# Altium footprint library RNG_Footprints.PcbLib: 134 footprints (part 7 of 9)
Each footprint in its own frame and in the unit in brackets; x right, y up, seen from the top. Pads: shape width x height; smd on the part's side, far side on the other; paste and mask are expansions set on the pad; w line width, h text height; cw(c..) or ccw(c..) is an arc to the next point about the centre after c.
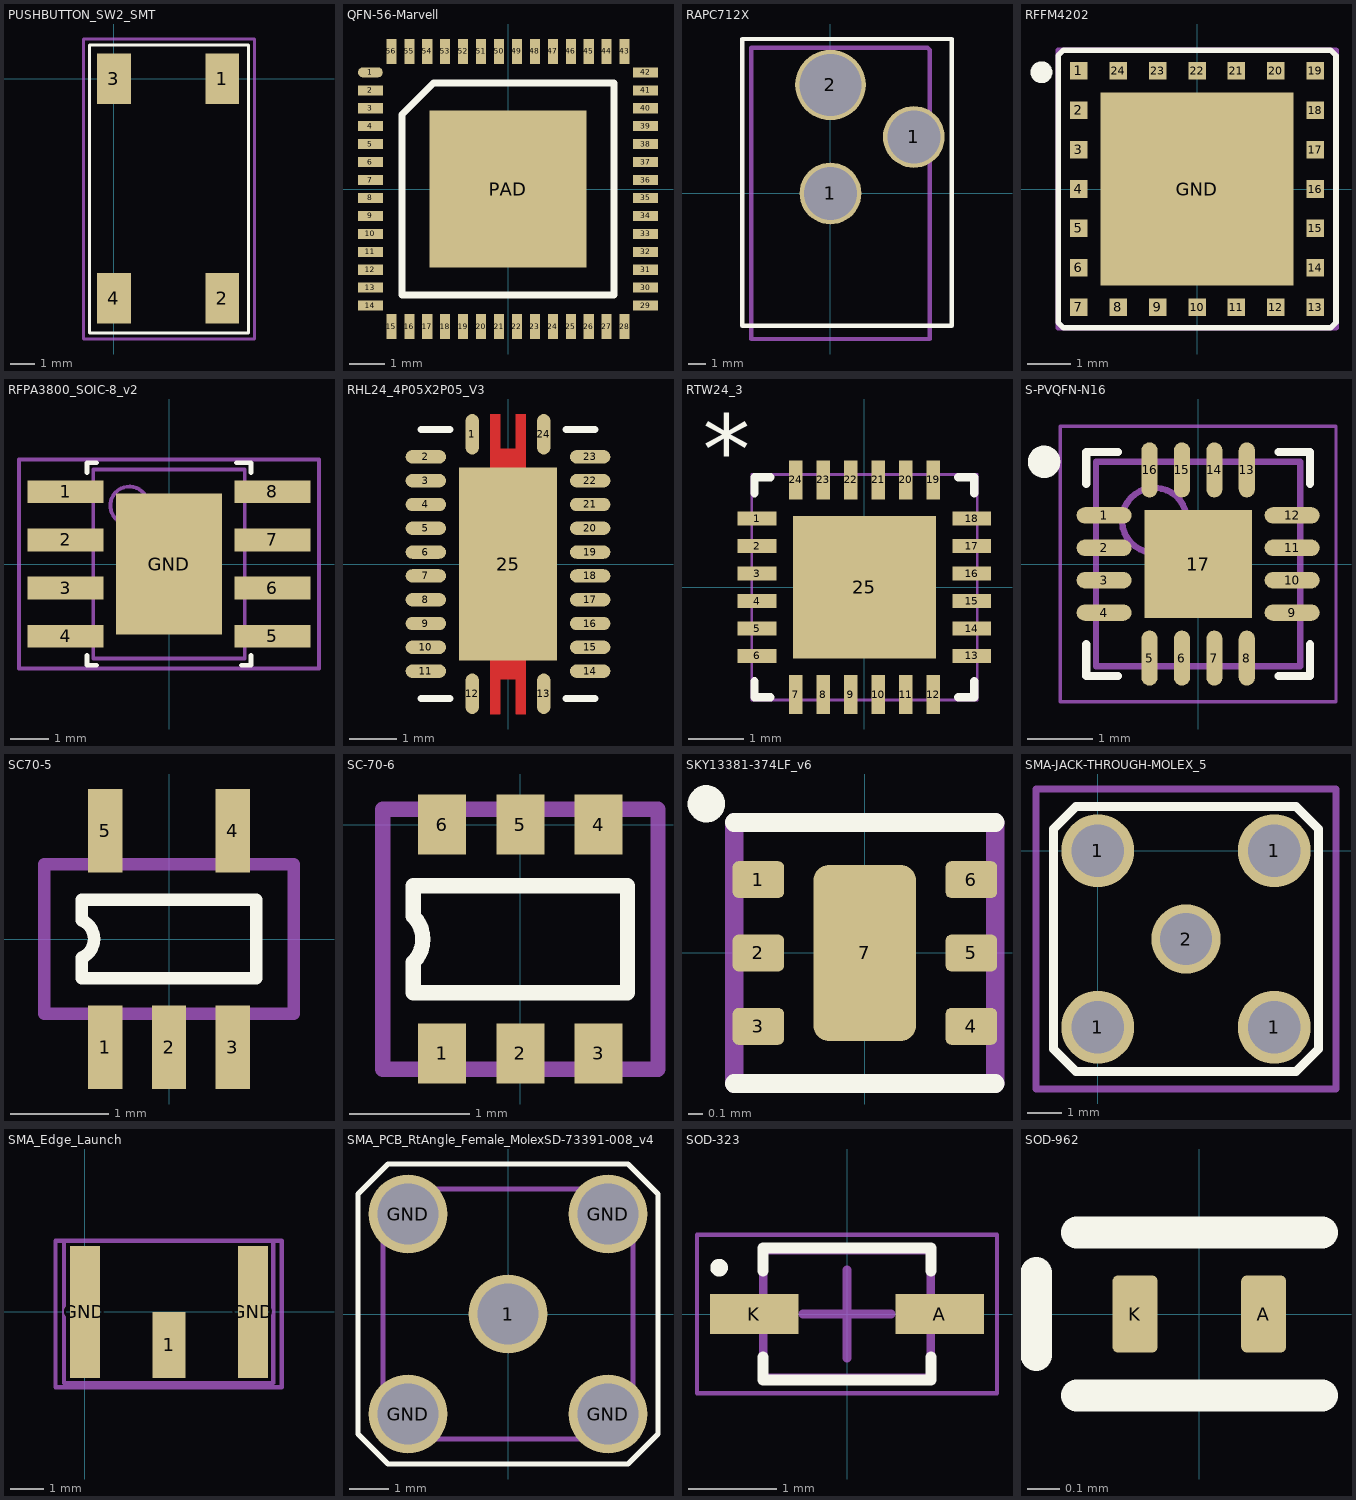
[diagram p6: the footprints below, top view; thin cyan lines are the x and y axes]

## PUSHBUTTON_SW2_SMT [mm] "SMT Pushbutton Switch, Mouser 506-1571563-9"
height 7.01
pads (4):
  rect 1.4x2.1 smd: 1(4.5,0) 2(4.5,-9.1) 3(0,0) 4(0,-9.1)
Top Overlay:
  lines w0.127: -1.016,-10.541 5.588,-10.541 5.588,1.397 -1.016,1.397 -1.016,-10.541
Mechanical 15:
  lines w0.127: -1.27,-10.795 5.842,-10.795 5.842,1.651 -1.27,1.651 -1.27,-10.795

## QFN-56-Marvell [mm]
pads (57):
  oval 0.69x0.28 smd: 1(-3.835,3.25)
  rect 0.69x0.28 smd: 2(-3.835,2.75) 3(-3.835,2.25) 4(-3.835,1.75) 5(-3.835,1.25) 6(-3.835,0.75) 7(-3.835,0.25) 8(-3.835,-0.25) 9(-3.835,-0.75) 10(-3.835,-1.25) 11(-3.835,-1.75) 12(-3.835,-2.25) 13(-3.835,-2.75) 14(-3.835,-3.25) 29(3.835,-3.25) 30(3.835,-2.75) 31(3.835,-2.25) 32(3.835,-1.75) 33(3.835,-1.25) 34(3.835,-0.75) 35(3.835,-0.25) 36(3.835,0.25) 37(3.835,0.75) 38(3.835,1.25) 39(3.835,1.75) 40(3.835,2.25) 41(3.835,2.75) 42(3.835,3.25)
  rect 0.28x0.69 smd: 15(-3.25,-3.835) 16(-2.75,-3.835) 17(-2.25,-3.835) 18(-1.75,-3.835) 19(-1.25,-3.835) 20(-0.75,-3.835) 21(-0.25,-3.835) 22(0.25,-3.835) 23(0.75,-3.835) 24(1.25,-3.835) 25(1.75,-3.835) 26(2.25,-3.835) 27(2.75,-3.835) 28(3.25,-3.835) 43(3.25,3.835) 44(2.75,3.835) 45(2.25,3.835) 46(1.75,3.835) 47(1.25,3.835) 48(0.75,3.835) 49(0.25,3.835) 50(-0.25,3.835) 51(-0.75,3.835) 52(-1.25,3.835) 53(-1.75,3.835) 54(-2.25,3.835) 55(-2.75,3.835) 56(-3.25,3.835)
  rect 4.37x4.37 smd: PAD(0,0)
Top Overlay:
  lines w0.2: -2.955,-2.955 -2.955,2.075 -2.075,2.955 2.955,2.955 2.955,-2.955 -2.955,-2.955
3D body "User Library-QFN56 (8x8).STEP": height 0.96, standoff 0.01, extent -4.015,-4.015 4.015,4.015

## RAPC712X [mil] "Rt Angle 2.5mm PCB Thru DC Power Jack RAPC712X"
height 1692.91
pads (3):
  round 140 hole 120: 1(0,0) 1(189,128)
  round 160 hole 140: 2(0,246)
Top Overlay:
  lines w10: -200,-300 -200,350 275,350 275,-300 -200,-300
Mechanical 15:
  lines w10: -180,-330 -180,330 220,330 225,325 225,-330 -180,-330
3D body: height 430, standoff 0, extent -175,-324 175,324

## RFFM4202 [mm] "RFFM4202_2.4GHZ_FEM_LAMINATE"
height 0.975
pads (25):
  rect 0.4x0.4 smd paste-0.02 mask+0.065: 1(-2.7,2.7) 2(-2.7,1.8) 3(-2.7,0.9) 4(-2.7,0) 5(-2.7,-0.9) 6(-2.7,-1.8) 7(-2.7,-2.7) 8(-1.8,-2.7) 9(-0.9,-2.7) 10(0,-2.7) 11(0.9,-2.7) 12(1.8,-2.7) 13(2.7,-2.7) 14(2.7,-1.8) 15(2.7,-0.9) 16(2.7,0) 17(2.7,0.9) 18(2.7,1.8) 19(2.7,2.7) 20(1.8,2.7) 21(0.9,2.7) 22(0,2.7) 23(-0.9,2.7) 24(-1.8,2.7)
  rect 4.4x4.4 smd paste-2.2 mask+0.065: GND(0,0)
Top Overlay:
  circle w0.25: c-3.554,2.667 r0.125
  lines w0.127: -3.175,-3.048 -3.048,-3.175 3.048,-3.175 3.175,-3.048 3.175,3.048 3.048,3.175 -3.048,3.175 -3.175,3.048 -3.175,-3.048
Top Paste:
  rectangle: -2.095,0.205 -0.205,2.095
  rectangle: 0.205,0.205 2.095,2.095
  rectangle: -2.095,-2.095 -0.205,-0.205
  rectangle: 0.205,-2.095 2.095,-0.205
Mechanical 15:
  lines w0.127: -3.175,-3.175 3.175,-3.175 3.175,3.175 -3.175,3.175 -3.175,-3.175
3D body: height 0.97, standoff 0, extent -3,-3 3,3

## RFPA3800_SOIC-8_v2 [mm] "SOIC, 8-Leads, Body 5.0x4.0mm (max), Pitch 1.27mm, IPC Medium Density"
height 1.727
pads (9):
  rect 2x0.6 smd: 1(-2.725,1.905) 2(-2.725,0.635) 3(-2.725,-0.635) 4(-2.725,-1.905) 5(2.725,-1.905) 6(2.725,-0.635) 7(2.725,0.635) 8(2.725,1.905)
  rect 2.8x3.7 smd: GND(0,0)
Top Overlay:
  lines w0.127: -2.159,-2.413 -2.159,-2.667 -1.905,-2.667 ; -2.159,2.413 -2.159,2.667 -1.905,2.667 ; 1.778,2.667 2.159,2.667 2.159,2.413 ; 1.905,-2.667 2.159,-2.667 2.159,-2.413
  text "." at -1.397,2.032 h0.76
Mechanical 13:
  circle w0.1: c-1.045,1.54 r0.5
  lines w0.1: -1.995,-2.49 1.995,-2.49 1.995,2.49 -1.995,2.49 -1.995,-2.49
Mechanical 15:
  lines w0.1: -0.5,0 0.5,0 ; 0,-0.5 0,0.5 ; -3.95,-2.75 3.95,-2.75 3.95,2.75 -3.95,2.75 -3.95,-2.75
3D body: height 1.73, standoff 0.19, extent -1.995,-2.49 1.995,2.49

## RHL24_4P05X2P05_V3 [mm] "TI Bus Translator RVQFN Package"
height 1
pads (25):
  oval 0.28x0.85 smd mask+0.064: 1(-0.75,2.725) 12(-0.75,-2.725) 13(0.75,-2.725) 24(0.75,2.725)
  oval 0.85x0.28 smd mask+0.064: 2(-1.725,2.25) 3(-1.725,1.75) 4(-1.725,1.25) 5(-1.725,0.75) 6(-1.725,0.25) 7(-1.725,-0.25) 8(-1.725,-0.75) 9(-1.725,-1.25) 10(-1.725,-1.75) 11(-1.725,-2.25) 14(1.725,-2.25) 15(1.725,-1.75) 16(1.725,-1.25) 17(1.725,-0.75) 18(1.725,-0.25) 19(1.725,0.25) 20(1.725,0.75) 21(1.725,1.25) 22(1.725,1.75) 23(1.725,2.25)
  rect 2.05x4.05 smd paste-3.175: 25(0,0)
Top Layer:
  region: -0.375,2.025 0.375,2.025 0.375,3.15 0.16,3.15 0.16,2.425 -0.16,2.425 -0.16,3.15 -0.375,3.15
  region: -0.375,-2.025 0.375,-2.025 0.375,-3.15 0.16,-3.15 0.16,-2.425 -0.16,-2.425 -0.16,-3.15 -0.375,-3.15
Top Overlay:
  lines w0.152: -1.825,-2.825 -1.223,-2.825 ; -1.825,2.825 -1.223,2.825 ; 1.223,-2.825 1.825,-2.825 ; 1.223,2.825 1.825,2.825
  text "." at -1.524,3.429 h1.27
Top Paste:
  rectangle: 0.03,-0.55 0.97,0.55
  rectangle: -0.97,-0.55 -0.03,0.55
  rectangle: -0.97,0.847 -0.03,1.947
  rectangle: 0.046,0.847 0.986,1.947
  rectangle: -0.97,-1.947 -0.03,-0.847
  rectangle: 0.046,-1.947 0.986,-0.847
  rectangle: -0.33,-3.048 -0.203,-2.032
  rectangle: 0.203,-3.048 0.33,-2.032
  rectangle: 0.203,2.032 0.33,3.048
  rectangle: -0.33,2.032 -0.203,3.048
3D body: height 1, standoff 0.08, extent -1.825,-2.825 1.825,2.825

## RTW24_3 [mm] "WQFN-24_TI"
height 0.8
pads (25):
  rect 0.705x0.25 smd mask+0.076: 1(-1.952,1.25) 2(-1.952,0.75) 3(-1.952,0.25) 4(-1.952,-0.25) 5(-1.952,-0.75) 6(-1.952,-1.25) 13(1.952,-1.25) 14(1.952,-0.75) 15(1.952,-0.25) 16(1.952,0.25) 17(1.952,0.75) 18(1.952,1.25)
  rect 0.25x0.705 smd mask+0.076: 7(-1.25,-1.952) 8(-0.75,-1.952) 9(-0.25,-1.952) 10(0.25,-1.952) 11(0.75,-1.952) 12(1.25,-1.952) 19(1.25,1.952) 20(0.75,1.952) 21(0.25,1.952) 22(-0.25,1.952) 23(-0.75,1.952) 24(-1.25,1.952)
  rect 2.6x2.6 smd paste-1.287: 25(0,0)
Top Overlay:
  lines w0.152: -2,-1.708 -2,-2 -1.708,-2 ; -2,1.708 -2,2 -1.708,2 ; 1.708,-2 2,-2 2,-1.708 ; 1.708,2 2,2 2,1.708
  text "*" at -2.94,1.881 h1.27
Top Paste:
  region: 1.2,-0.1 0.1,-0.1 0.1,-1.2 1.2,-1.2
  region: 1.2,1.2 0.1,1.2 0.1,0.1 1.2,0.1
  region: -0.1,-0.1 -1.2,-0.1 -1.2,-1.2 -0.1,-1.2
  region: -0.1,1.2 -1.2,1.2 -1.2,0.1 -0.1,0.1
Mechanical 13:
  lines w0.05: -2.05,-2.05 -2.05,2.05 2.05,2.05 2.05,-2.05 -2.05,-2.05
3D body "User Library-QFN 24 4x4.STEP": height 0.91, standoff 0.01, extent -2.002,-2.002 2.002,2.002

## S-PVQFN-N16 [mm] "QFN, 16-Leads, Body 3.00x3.00mm, Pitch 0.50mm, Thermal Pad 1.66x1.66mm, IPC Medium Density"
height 1
pads (17):
  oval 0.85x0.25 smd: 1(-1.45,0.75) 2(-1.45,0.25) 3(-1.45,-0.25) 4(-1.45,-0.75) 9(1.45,-0.75) 10(1.45,-0.25) 11(1.45,0.25) 12(1.45,0.75)
  oval 0.25x0.85 smd: 5(-0.75,-1.45) 6(-0.25,-1.45) 7(0.25,-1.45) 8(0.75,-1.45) 13(0.75,1.45) 14(0.25,1.45) 15(-0.25,1.45) 16(-0.75,1.45)
  rect 1.66x1.66 smd: 17(0,0)
Top Overlay:
  circle w0.25: c-2.375,1.575 r0.125
  lines w0.125: -1.725,-1.238 -1.725,-1.725 -1.238,-1.725 ; -1.725,1.238 -1.725,1.725 -1.238,1.725 ; 1.238,-1.725 1.725,-1.725 1.725,-1.238 ; 1.238,1.725 1.725,1.725 1.725,1.238
Mechanical 13:
  circle w0.1: c-0.675,0.675 r0.5
  lines w0.1: -1.575,-1.575 -1.575,1.575 1.575,1.575 1.575,-1.575 -1.575,-1.575
Mechanical 15:
  lines w0.05: -2.125,-2.125 -2.125,2.125 2.125,2.125 2.125,-2.125 -2.125,-2.125
  lines w0.1: -0.5,0 0.5,0 ; 0,-0.5 0,0.5
3D body: height 1, standoff 0.08, extent -1.575,-1.575 1.575,1.575

## SC70-5 [mm] "TI SC70 5-pin package"
height 1.1
pads (5):
  rect 0.35x0.85 smd mask+0.05: 1(-0.65,-1.1) 2(0,-1.1) 3(0.65,-1.1) 4(0.65,1.1) 5(-0.65,1.1)
Top Overlay:
  lines w0.127: -0.889,-0.4 0.889,-0.4 0.889,0.4 -0.889,0.4 -0.889,0.191 cw(c-0.968,0) -0.889,-0.191 -0.889,-0.4
  text "." at -1.143,-0.762 h0.5
Mechanical 15:
  lines w0.127: -1.27,-0.762 -1.27,0.762 1.27,0.762 1.27,-0.762 -1.27,-0.762
3D body: height 1.1, standoff 0.1, extent -1.25,-0.7 1.25,0.7

## SC-70-6 [mm] "Fairchild SC-70 6-pin package"
height 1
pads (6):
  rect 0.4x0.5 smd mask+0.05: 1(-0.65,-1.9) 2(0,-1.9) 3(0.65,-1.9) 4(0.65,0) 5(0,0) 6(-0.65,0)
Top Overlay:
  lines w0.127: -0.889,-1.397 -0.889,-1.143 ccw(c-1.079,-0.953) -0.889,-0.762 -0.889,-0.508 0.889,-0.508 0.889,-1.397 -0.889,-1.397
  text "." at -1.143,-1.651 h0.5
Mechanical 15:
  lines w0.127: -1.143,-2.032 -1.143,0.127 1.143,0.127 1.143,-2.032 -1.143,-2.032
3D body: height 1.1, standoff 0.1, extent -1.1,-1.625 1.1,-0.275

## SKY13381-374LF_v6 [mm] "SKY13381_DPDT_Switch_MLPD_1.5x1.5mm"
height 0.41
pads (7):
  rrect30% 0.35x0.25 smd paste-0.025 mask+0.05: 1(-0.725,0.5) 2(-0.725,0) 3(-0.725,-0.5) 4(0.725,-0.5) 5(0.725,0) 6(0.725,0.5)
  rrect30% 0.7x1.2 smd paste-0.05 mask+0.05: 7(0,0)
Top Overlay:
  circle w0.127: c-1.079,1.016 r0.064
  lines w0.127: -0.889,-0.889 0.889,-0.889 ; -0.889,0.889 0.889,0.889
Top Paste:
  rectangle: -0.1,-0.75 0.1,0.75
Top Solder:
  rectangle: -0.1,-0.75 0.1,0.75
Mechanical 15:
  lines w0.127: -0.889,-0.889 0.889,-0.889 0.889,0.889 -0.889,0.889 -0.889,-0.889
3D body: height 0.5, standoff 0.02, extent -0.725,-0.725 0.725,0.725

## SMA-JACK-THROUGH-MOLEX_5 [mm] "SMA Female Jack Through-Mount PCB Connector"
height 13.5
pads (5):
  round 2.1 hole 1.5: 1(0,-5.08) 1(0,0) 1(5.08,-5.08) 1(5.08,0)
  round 2 hole 1.5: 2(2.54,-2.54)
Top Overlay:
  lines w0.254: -1.27,-5.715 -0.635,-6.35 5.715,-6.35 6.35,-5.715 6.35,0.635 5.715,1.27 -0.635,1.27 -1.27,0.635 -1.27,-5.715
Mechanical 15:
  lines w0.2: -1.778,-6.858 -1.778,1.778 6.858,1.778 6.858,-6.858 -1.778,-6.858

## SMA_Edge_Launch [mm] "SMA Edge Launch, 1.45mm Board Thickness"
height 6
pads (3):
  rect 1x2 smd: 1(2.55,-1)
  rect 0.9x4 smd: GND(0,0) GND(5.1,0)
Mechanical 13:
  lines w0.127: -0.635,-2.159 -0.635,2.159 5.715,2.159 5.715,-2.159 -0.635,-2.159
Mechanical 15:
  lines w0.127: -0.889,-2.286 -0.889,2.159 5.969,2.159 5.969,-2.286 -0.889,-2.286

## SMA_PCB_RtAngle_Female_MolexSD-73391-008_v4 [mm] "SMA Female Jack Through-Mount Right Angle"
height 10.07
pads (5):
  round 2 hole 1.54: 1(0,0) GND(-2.54,-2.54) GND(-2.54,2.54) GND(2.54,-2.54) GND(2.54,2.54)
Top Overlay:
  lines w0.127: -3.81,-3.048 -3.048,-3.81 3.048,-3.81 3.81,-3.048 3.81,3.048 3.048,3.81 -3.048,3.81 -3.81,3.048 -3.81,2.54 -3.81,-3.048
Mechanical 15:
  lines w0.127: -3.175,-3.175 3.175,-3.175 3.175,3.175 -3.175,3.175 -3.175,-3.175
3D body: height 10.05, standoff 3.72, extent -3.169,3.2 3.169,11.65
3D body: height 10.07, standoff 0.5, extent -3.175,-3.175 3.175,3.175

## SOD-323 [mm] "SODFL, 2-Leads, Body 1.30x2.50mm, IPC Medium Density"
height 1.1
pads (2):
  rect 1x0.45 smd: A(1.05,0) K(-1.05,0)
Top Overlay:
  circle w0.1: c-1.45,0.525 r0.05
  lines w0.125: -0.95,-0.487 -0.95,-0.75 0.95,-0.75 0.95,-0.487 ; -0.95,0.487 -0.95,0.75 0.95,0.75 0.95,0.487
Mechanical 13:
  lines w0.1: -0.95,-0.725 -0.95,0.725 0.95,0.725 0.95,-0.725 -0.95,-0.725
Mechanical 15:
  lines w0.05: -1.7,-0.9 -1.7,0.9 1.7,0.9 1.7,-0.9 -1.7,-0.9
  lines w0.1: -0.5,0 0.5,0 ; 0,-0.5 0,0.5
3D body "SW3dPS-SOD-323.STEP": height 1.1, standoff 0, extent -1.3,-0.675 1.3,0.675

## SOD-962 [mm] "Leadless Ultra-Small Diode Package, NXP"
height 0.32
pads (2):
  rrect25% 0.14x0.24 smd paste-0.12 mask+0: A(0.2,0) K(-0.2,0)
Top Overlay:
  lines w0.1: -0.508,-0.127 -0.508,0.127 ; -0.381,-0.254 0.381,-0.254 ; -0.381,0.254 0.381,0.254
Top Paste:
  circle w0.02: c-0.2,0 r0.1
  circle w0.02: c0.2,0 r0.1
  region: 0.2,-0.1 0.18,-0.1 0.143,-0.085 0.115,-0.057 0.1,-0.02 0.1,0 0.1,0.02 0.115,0.057 0.143,0.085 0.18,0.1 0.2,0.1 0.22,0.1 0.257,0.085 0.285,0.057 0.3,0.02 0.3,0 0.3,-0.02 0.285,-0.057 0.257,-0.085 0.22,-0.1
  region: -0.2,-0.1 -0.22,-0.1 -0.257,-0.085 -0.285,-0.057 -0.3,-0.02 -0.3,0 -0.3,0.02 -0.285,0.057 -0.257,0.085 -0.22,0.1 -0.2,0.1 -0.18,0.1 -0.143,0.085 -0.115,0.057 -0.1,0.02 -0.1,0 -0.1,-0.02 -0.115,-0.057 -0.143,-0.085 -0.18,-0.1
Top Solder:
  rectangle: -0.425,-0.2 0.425,0.2
3D body: height 0.32, standoff 0.03, extent -0.312,-0.162 0.312,0.162